# Altium footprint library MyPcbLib.PcbLib: 237 footprints (part 1 of 15)
Each footprint in its own frame and in the unit in brackets; x right, y up, seen from the top. Pads: shape width x height; smd on the part's side, far side on the other; paste and mask are expansions set on the pad; w line width, h text height; cw(c..) or ccw(c..) is an arc to the next point about the centre after c.
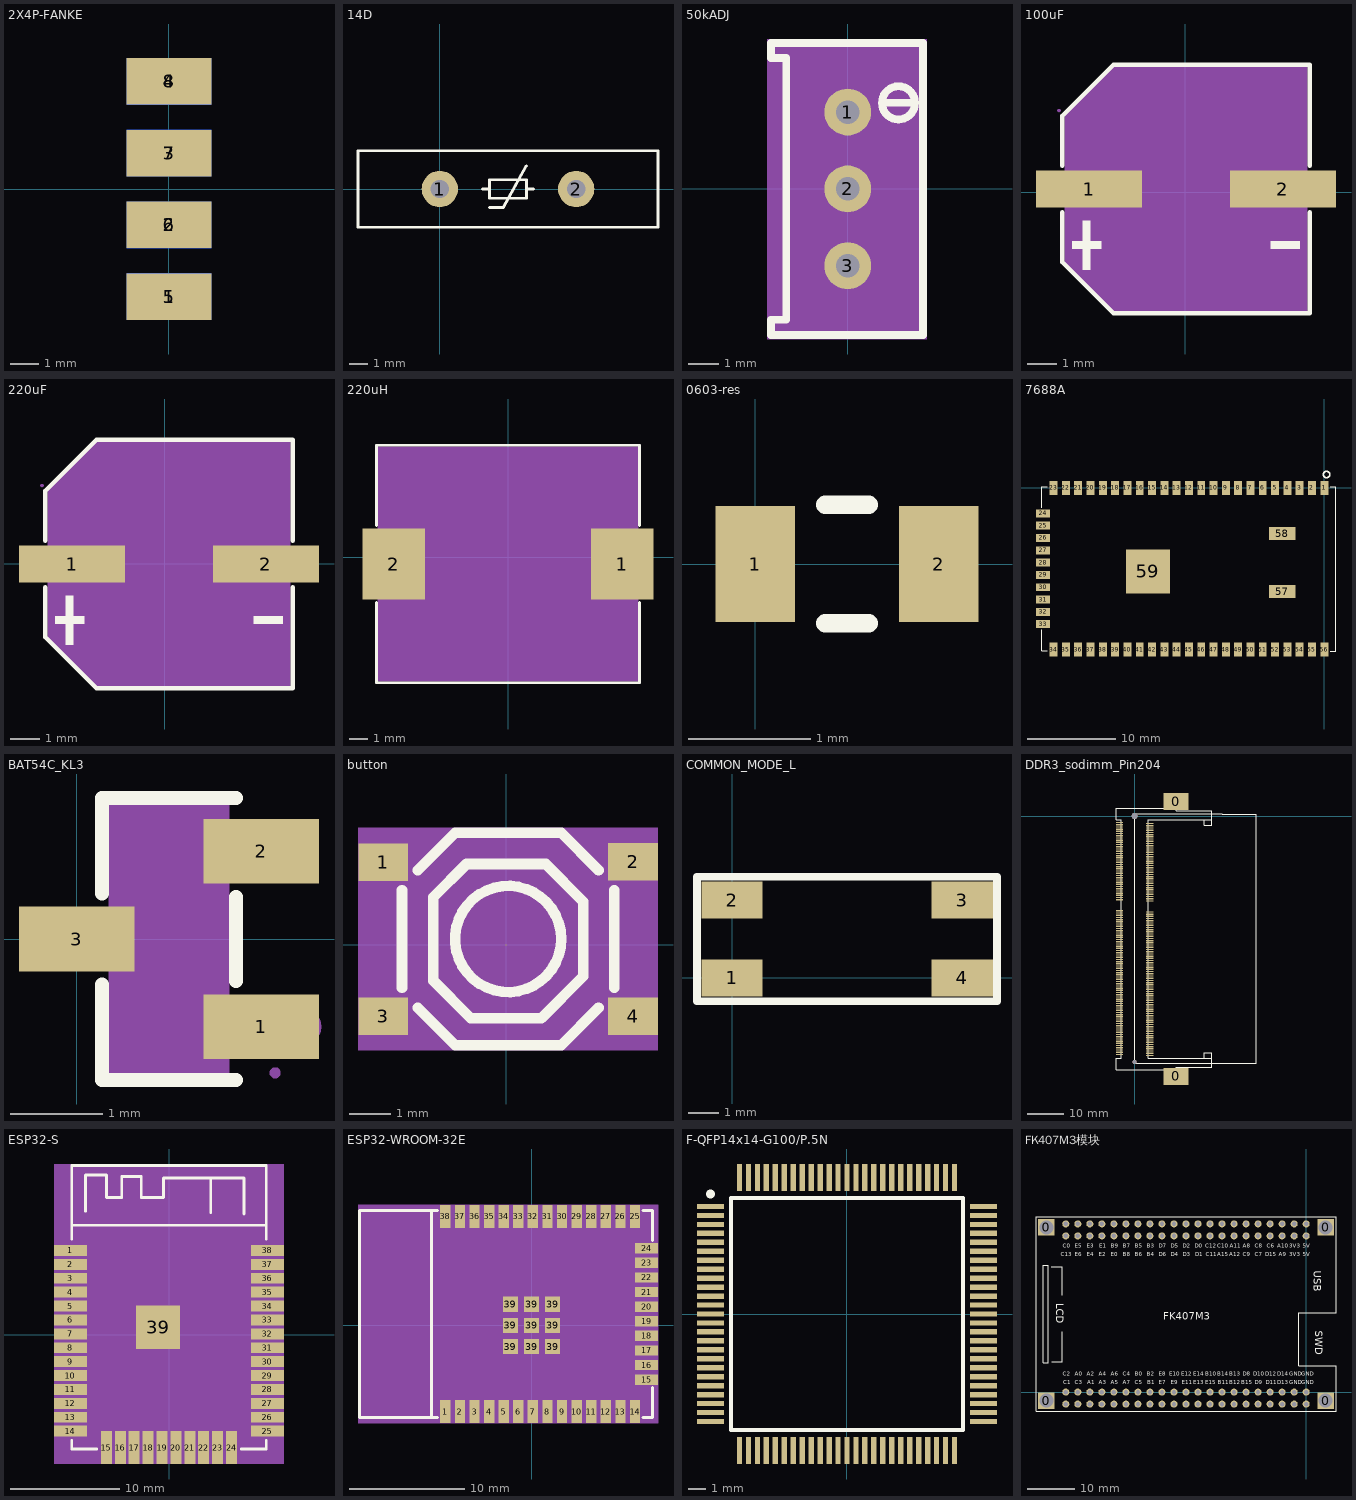
[diagram p0: the footprints below, top view; thin cyan lines are the x and y axes]

## 2X4P-FANKE [mm]
pads (8):
  rect 3x1.65 smd: 1(0,-3.81) 2(0,-1.27) 3(0,1.27) 4(0,3.81)
  rect 3x1.65 smd far side: 5(0,-3.81) 6(0,-1.27) 7(0,1.27) 8(0,3.81)
3D body "User Library-2_54mm Male Header (4x2).STEP": height 1.84, standoff -3.14, extent -1.249,-5.08 10.291,5.08

## 14D [mm]
pads (2):
  round 2 hole 1: 1(0,0) 2(7.5,0)
Top Overlay:
  lines w0.152: 2.353,0 2.734,0 ; 2.734,-1.016 3.496,-1.016 4.766,1.27 ; 4.766,0 5.147,0 ; -4.5,-2.1 12,-2.1 12,2.1 -4.5,2.1 -4.5,-2.1 ; 2.734,-0.508 2.734,0.508 4.766,0.508 4.766,-0.508 2.734,-0.508

## 50kADJ [mil]
pads (3):
  round 60 hole 30: 1(0,98.42) 2(0,0) 3(0,-98.42)
Top Overlay:
  lines w10: 50,110.39 65,110.39 ; 86.2,109.99 cw(c64.99,110.19) 86.2,110.4 ; 96.46,-187.22 -96.46,-187.22 -98.42,-187.22 -98.42,-167.52 -78.74,-167.52 -78.74,167.52 -98.42,167.52 -98.42,187.01 -96.46,187.01 96.46,187.01 96.46,-187.01 ; 65,110.39 80,110.39 65,110.39
Mechanical 4:
  region: -103.42,192.01 101.46,192.01 101.46,-192.22 -103.42,-192.22
Mechanical 5:
  region: -30,30 30,30 30,-30 -30,-30
  region: -30,128.43 30,128.43 30,68.42 -30,68.42
  region: -30,-68.42 30,-68.42 30,-128.43 -30,-128.43
Mechanical 15:
  lines w0.1: -1.98,14.34 0.02,16.34

## 100uF [mm]
pads (2):
  rect 3.61x1.26 smd: 1(-3.275,0.111) 2(3.315,0.111)
Top Overlay:
  region: 3.896,-1.673 3.896,-1.922 2.9,-1.922 2.9,-1.673
  region: -3.856,-1.673 -3.856,-1.922 -2.86,-1.922 -2.86,-1.673
  region: -3.483,-0.968 -3.483,-2.628 -3.234,-2.628 -3.234,-0.968
  lines w0.152: -4.181,-0.671 -4.181,-2.379 -2.445,-4.115 4.221,-4.115 4.221,-0.671 ; -4.181,0.894 -4.181,2.601 -2.445,4.338 4.221,4.338 4.221,0.894
Mechanical 4:
  region: 4.145,4.261 4.145,-4.039 -2.445,-4.039 -4.105,-2.379 -4.105,2.601 -2.445,4.261
Mechanical 5:
  region: 4.52,0.561 4.52,-0.339 1.57,-0.339 1.57,0.561
  region: -4.48,0.561 -4.48,-0.339 -1.53,-0.339 -1.53,0.561
Mechanical 6:
  circle w0.06: c-4.298,2.778 r0.03
Mechanical 15:
  region: 3.896,0.236 3.896,-0.013 2.9,-0.013 2.9,0.236
  region: -3.856,0.236 -3.856,-0.013 -2.86,-0.013 -2.86,0.236
  region: -3.483,0.941 -3.483,-0.719 -3.234,-0.719 -3.234,0.941

## 220uF [mm]
pads (2):
  rect 3.61x1.26 smd: 1(-3.148,-0.016) 2(3.442,-0.016)
Top Overlay:
  region: 4.023,-1.8 4.023,-2.049 3.027,-2.049 3.027,-1.8
  region: -3.729,-1.8 -3.729,-2.049 -2.733,-2.049 -2.733,-1.8
  region: -3.356,-1.095 -3.356,-2.755 -3.107,-2.755 -3.107,-1.095
  lines w0.152: -4.054,-0.798 -4.054,-2.506 -2.318,-4.242 4.348,-4.242 4.348,-0.798 ; -4.054,0.767 -4.054,2.474 -2.318,4.211 4.348,4.211 4.348,0.767
Mechanical 4:
  region: 4.272,4.134 4.272,-4.166 -2.318,-4.166 -3.978,-2.506 -3.978,2.474 -2.318,4.134
Mechanical 5:
  region: 4.647,0.434 4.647,-0.466 1.697,-0.466 1.697,0.434
  region: -4.353,0.434 -4.353,-0.466 -1.403,-0.466 -1.403,0.434
Mechanical 6:
  circle w0.06: c-4.171,2.651 r0.03
Mechanical 15:
  region: 4.023,0.109 4.023,-0.14 3.027,-0.14 3.027,0.109
  region: -3.729,0.109 -3.729,-0.14 -2.733,-0.14 -2.733,0.109
  region: -3.356,0.814 -3.356,-0.846 -3.107,-0.846 -3.107,0.814

## 220uH [mm]
pads (2):
  rect 3.424x3.92 smd: 1(6.267,-0.383) 2(-6.289,-0.383)
Top Overlay:
  lines w0.152: -7.237,-2.495 -7.237,-6.909 7.215,-6.909 7.215,-2.495 ; -7.237,1.73 -7.237,6.144 7.215,6.144 7.215,1.73
Mechanical 4:
  region: -7.161,-6.833 -7.161,6.067 7.139,6.067 7.139,-6.833
Mechanical 5:
  region: 7.139,-2.133 7.139,1.367 4.639,1.367 4.639,-2.133
  region: -7.161,-2.133 -7.161,1.367 -4.661,1.367 -4.661,-2.133
Mechanical 6:
  circle w0.06: c-7.161,-6.833 r0.03
Mechanical 15:
  lines w0.003: -0.036,0.006 0.014,0.056

## 0603-res [mm]
height 0.35
pads (2):
  rect 0.65x0.95 smd: 1(0,0) 2(1.5,0)
Top Overlay:
  lines w0.152: 0.572,-0.483 0.928,-0.483 ; 0.572,0.483 0.928,0.483
3D body "0603-res.step": height 0.35, standoff 0, extent -0.125,-0.475 1.625,0.475

## 7688A [mm]
height 2.5
pads (59):
  rect 0.9x1.6 smd: 1(0,0) 2(-1.4,0) 3(-2.8,0) 4(-4.2,0) 5(-5.6,0) 6(-7,0) 7(-8.4,0) 8(-9.8,0) 9(-11.2,0) 10(-12.6,0) 11(-14,0) 12(-15.4,0) 13(-16.8,0) 14(-18.2,0) 15(-19.6,0) 16(-21,0) 17(-22.4,0) 18(-23.8,0) 19(-25.2,0) 20(-26.6,0) 21(-28,0) 22(-29.4,0) 23(-30.8,0) 34(-30.8,-18.4) 35(-29.4,-18.4) 36(-28,-18.4) 37(-26.6,-18.4) 38(-25.2,-18.4) 39(-23.8,-18.4) 40(-22.4,-18.4) 41(-21,-18.4) 42(-19.6,-18.4) 43(-18.2,-18.4) 44(-16.8,-18.4) 45(-15.4,-18.4) 46(-14,-18.4) 47(-12.6,-18.4) 48(-11.2,-18.4) 49(-9.8,-18.4) 50(-8.4,-18.4) 51(-7,-18.4) 52(-5.6,-18.4) 53(-4.2,-18.4) 54(-2.8,-18.4) 55(-1.4,-18.4) 56(0,-18.4)
  rect 1.6x0.9 smd: 24(-32,-2.9) 25(-32,-4.3) 26(-32,-5.7) 27(-32,-7.1) 28(-32,-8.5) 29(-32,-9.9) 30(-32,-11.3) 31(-32,-12.7) 32(-32,-14.1) 33(-32,-15.5)
  rect 3x1.5 smd: 57(-4.8,-11.8) 58(-4.8,-5.2)
  rect 5x5 smd: 59(-20.066,-9.5)
Top Overlay:
  circle w0.15: c0.254,1.524 r0.359
  lines w0.1: -32.131,-16.129 -32.131,-18.542 -31.496,-18.542 ; -32.131,-2.271 -32.131,0.142 -31.496,0.142 ; 0.696,-18.557 1.331,-18.557 1.331,0.142 0.696,0.142

## BAT54C_KL3 [mm]
pads (3):
  rect 1.25x0.7 smd: 1(2,-0.95) 2(2,0.95) 3(0,0)
Top Overlay:
  lines w0.152: 0.274,-0.495 0.274,-1.526 1.726,-1.526 ; 0.274,0.495 0.274,1.526 1.726,1.526 ; 1.726,-0.455 1.726,0.455
Mechanical 4:
  region: 0.35,-1.45 0.35,1.45 1.65,1.45 1.65,-1.45
Mechanical 5:
  region: 1.85,-1.165 1.85,-0.735 2.15,-0.735 2.15,-1.165
  pour cut-out: 1.64,-1.165 1.64,-0.735 1.86,-0.735 1.86,-1.165
  region: 1.85,0.735 1.85,1.165 2.15,1.165 2.15,0.735
  pour cut-out: 1.64,0.735 1.64,1.165 1.86,1.165 1.86,0.735
  region: 0.15,-0.215 0.15,0.215 -0.15,0.215 -0.15,-0.215
  pour cut-out: 0.14,-0.215 0.14,0.215 0.36,0.215 0.36,-0.215
Mechanical 6:
  circle w0.06: c2.15,-1.45 r0.03
Mechanical 15:
  circle w0.2: c2.45,-0.95 r0.1

## button [mm]
pads (4):
  rect 1.2x0.9 smd: 1(-2.949,1.986) 2(3.051,1.988) 3(-2.949,-1.713) 4(3.051,-1.713)
Top Overlay:
  circle w0.254: c0.051,0.137 r1.275
  lines w0.254: -2.499,-1.031 -2.499,1.306 ; -2.119,-1.518 -1.224,-2.413 1.326,-2.413 2.221,-1.518 ; -2.119,1.792 -1.224,2.687 1.326,2.687 2.221,1.792 ; 2.601,-1.031 2.601,1.306 ; -1.75,-0.861 -0.848,-1.763 0.851,-1.763 1.852,-0.762 1.852,1.036 0.95,1.938 -0.95,1.938 -1.75,1.138 -1.75,-0.861
Mechanical 4:
  region: -3.556,2.814 3.65,2.814 3.65,-2.54 -3.556,-2.54
Mechanical 5:
  region: -3.549,2.436 -2.35,2.436 -2.35,1.537 -3.549,1.537
  region: 2.451,2.438 3.65,2.438 3.65,1.537 2.451,1.537
  region: -3.549,-1.262 -2.35,-1.262 -2.35,-2.164 -3.549,-2.164
  region: 2.451,-1.262 3.65,-1.262 3.65,-2.164 2.451,-2.164

## COMMON_MODE_L [mm]
pads (4):
  rect 2x1.2 smd: 1(0,0) 2(0,2.54) 3(7.5,2.54) 4(7.5,0)
Top Overlay:
  lines w0.254: -1.143,-0.762 8.636,-0.762 8.636,3.302 -1.143,3.302 -1.143,-0.762

## DDR3_sodimm_Pin204 [mm]
pads (208):
  round 1.1 hole 1.1 unplated: 0(0,-66.8)
  round 1.6 hole 1.6 unplated: 0(0,0)
  rect 6.8x4.7 smd: 0(11.3,-70.75) 0(11.3,3.95)
  rect 2x0.35 smd: 1(-4.1,-1.75) 2(4.1,-2.05) 3(-4.1,-2.35) 4(4.1,-2.65) 5(-4.1,-2.95) 6(4.1,-3.25) 7(-4.1,-3.55) 8(4.1,-3.85) 9(-4.1,-4.15) 10(4.1,-4.45) 11(-4.1,-4.75) 12(4.1,-5.05) 13(-4.1,-5.35) 14(4.1,-5.65) 15(-4.1,-5.95) 16(4.1,-6.25) 17(-4.1,-6.55) 18(4.1,-6.85) 19(-4.1,-7.15) 20(4.1,-7.45) 21(-4.1,-7.75) 22(4.1,-8.05) 23(-4.1,-8.35) 24(4.1,-8.65) 25(-4.1,-8.95) 26(4.1,-9.25) 27(-4.1,-9.55) 28(4.1,-9.85) 29(-4.1,-10.15) 30(4.1,-10.45) 31(-4.1,-10.75) 32(4.1,-11.05) 33(-4.1,-11.35) 34(4.1,-11.65) 35(-4.1,-11.95) 36(4.1,-12.25) 37(-4.1,-12.55) 38(4.1,-12.85) 39(-4.1,-13.15) 40(4.1,-13.45) 41(-4.1,-13.75) 42(4.1,-14.05) 43(-4.1,-14.35) 44(4.1,-14.65) 45(-4.1,-14.95) 46(4.1,-15.25) 47(-4.1,-15.55) 48(4.1,-15.85) 49(-4.1,-16.15) 50(4.1,-16.45) 51(-4.1,-16.75) 52(4.1,-17.05) 53(-4.1,-17.35) 54(4.1,-17.65) 55(-4.1,-17.95) 56(4.1,-18.25) 57(-4.1,-18.55) 58(4.1,-18.85) 59(-4.1,-19.15) 60(4.1,-19.45) 61(-4.1,-19.75) 62(4.1,-20.05) 63(-4.1,-20.35) 64(4.1,-20.65) 65(-4.1,-20.95) 66(4.1,-21.25) 67(-4.1,-21.55) 68(4.1,-21.85) 69(-4.1,-22.15) 70(4.1,-22.45) 71(-4.1,-22.75) 72(4.1,-23.05) 73(-4.1,-25.75) 74(4.1,-26.05) 75(-4.1,-26.35) 76(4.1,-26.65) 77(-4.1,-26.95) 78(4.1,-27.25) 79(-4.1,-27.55) 80(4.1,-27.85) 81(-4.1,-28.15) 82(4.1,-28.45) 83(-4.1,-28.75) 84(4.1,-29.05) 85(-4.1,-29.35) 86(4.1,-29.65) 87(-4.1,-29.95) 88(4.1,-30.25) 89(-4.1,-30.55) 90(4.1,-30.85) 91(-4.1,-31.15) 92(4.1,-31.45) 93(-4.1,-31.75) 94(4.1,-32.05) 95(-4.1,-32.35) 96(4.1,-32.65) 97(-4.1,-32.95) 98(4.1,-33.25) 99(-4.1,-33.55) 100(4.1,-33.85) 101(-4.1,-34.15) 102(4.1,-34.45) 103(-4.1,-34.75) 104(4.1,-35.05) 105(-4.1,-35.35) 106(4.1,-35.65) 107(-4.1,-35.95) 108(4.1,-36.25) 109(-4.1,-36.55) 110(4.1,-36.85) 111(-4.1,-37.15) 112(4.1,-37.45) 113(-4.1,-37.75) 114(4.1,-38.05) 115(-4.1,-38.35) 116(4.1,-38.65) 117(-4.1,-38.95) 118(4.1,-39.25) 119(-4.1,-39.55) 120(4.1,-39.85) 121(-4.1,-40.15) 122(4.1,-40.45) 123(-4.1,-40.75) 124(4.1,-41.05) 125(-4.1,-41.35) 126(4.1,-41.65) 127(-4.1,-41.95) 128(4.1,-42.25) 129(-4.1,-42.55) 130(4.1,-42.85) 131(-4.1,-43.15) 132(4.1,-43.45) 133(-4.1,-43.75) 134(4.1,-44.05) 135(-4.1,-44.35) 136(4.1,-44.65) 137(-4.1,-44.95) 138(4.1,-45.25) 139(-4.1,-45.55) 140(4.1,-45.85) 141(-4.1,-46.15) 142(4.1,-46.45) 143(-4.1,-46.75) 144(4.1,-47.05) 145(-4.1,-47.35) 146(4.1,-47.65) 147(-4.1,-47.95) 148(4.1,-48.25) 149(-4.1,-48.55) 150(4.1,-48.85) 151(-4.1,-49.15) 152(4.1,-49.45) 153(-4.1,-49.75) 154(4.1,-50.05) 155(-4.1,-50.35) 156(4.1,-50.65) 157(-4.1,-50.95) 158(4.1,-51.25) 159(-4.1,-51.55) 160(4.1,-51.85) 161(-4.1,-52.15) 162(4.1,-52.45) 163(-4.1,-52.75) 164(4.1,-53.05) 165(-4.1,-53.35) 166(4.1,-53.65) 167(-4.1,-53.95) 168(4.1,-54.25) 169(-4.1,-54.55) 170(4.1,-54.85) 171(-4.1,-55.15) 172(4.1,-55.45) 173(-4.1,-55.75) 174(4.1,-56.05) 175(-4.1,-56.35) 176(4.1,-56.65) 177(-4.1,-56.95) 178(4.1,-57.25) 179(-4.1,-57.55) 180(4.1,-57.85) 181(-4.1,-58.15) 182(4.1,-58.45) 183(-4.1,-58.75) 184(4.1,-59.05) 185(-4.1,-59.35) 186(4.1,-59.65) 187(-4.1,-59.95) 188(4.1,-60.25) 189(-4.1,-60.55) 190(4.1,-60.85) 191(-4.1,-61.15) 192(4.1,-61.45) 193(-4.1,-61.75) 194(4.1,-62.05) 195(-4.1,-62.35) 196(4.1,-62.65) 197(-4.1,-62.95) 198(4.1,-63.25) 199(-4.1,-63.55) 200(4.1,-63.85) 201(-4.1,-64.15) 202(4.1,-64.45) 203(-4.1,-64.75) 204(4.1,-65.05)
Top Overlay:
  lines w0.15: 20.9,-65.75 3.7,-65.75 3.7,-1.05 20.9,-1.05 ; 20.9,-65.75 20.9,-68.25 11.3,-68.25 11.3,-68.95 -5,-68.95 -5,-65.75 -3.7,-65.75 -3.7,-1.05 -5,-1.05 -5,2.15 11.3,2.15 11.3,1.45 20.9,1.45 20.9,-1.05 ; 20.9,-65.75 20.9,-64.35 18.9,-64.35 18.9,-65.75 20.9,-65.75 ; 20.9,-1.05 18.9,-1.05 18.9,-2.45 20.9,-2.45 20.9,-1.05
  lines w0.152: 23.825,0.566 0,0.566 0,-67.1 33.013,-67.1 33.013,0.553 23.838,0.553

## ESP32-S [mm]
pads (39):
  rect 3x1 smd: 1(-9.041,7.699) 2(-9.041,6.429) 3(-9.041,5.159) 4(-9.041,3.889) 5(-9.041,2.619) 6(-9.041,1.349) 7(-9.041,0.079) 8(-9.041,-1.191) 9(-9.041,-2.461) 10(-9.041,-3.731) 11(-9.041,-5.001) 12(-9.041,-6.271) 13(-9.041,-7.541) 14(-9.041,-8.811) 25(8.959,-8.811) 26(8.959,-7.541) 27(8.959,-6.271) 28(8.959,-5.001) 29(8.959,-3.731) 30(8.959,-2.461) 31(8.959,-1.191) 32(8.959,0.079) 33(8.959,1.349) 34(8.959,2.619) 35(8.959,3.889) 36(8.959,5.159) 37(8.959,6.429) 38(8.959,7.699)
  rect 1x3 smd: 15(-5.756,-10.311) 16(-4.486,-10.311) 17(-3.216,-10.311) 18(-1.946,-10.311) 19(-0.676,-10.311) 20(0.594,-10.311) 21(1.864,-10.311) 22(3.134,-10.311) 23(4.404,-10.311) 24(5.674,-10.311)
  rect 4x4 smd: 39(-1.041,0.689)
Top Overlay:
  lines w0.254: -8.931,-9.676 -8.931,-10.438 -6.645,-10.438 ; -8.931,8.739 -8.931,15.47 8.849,15.47 8.849,8.739 ; -8.931,10.009 8.849,10.009 ; -7.661,11.278 -7.661,14.58 -5.756,14.58 -5.756,12.548 -4.359,12.548 -4.359,14.453 -2.581,14.453 -2.581,12.548 -0.549,12.548 -0.549,14.326 6.817,14.326 6.817,11.024 ; 3.769,11.152 3.769,14.327 ; 6.563,-10.438 8.849,-10.438 8.849,-9.676
Mechanical 4:
  region: -10.541,15.597 10.465,15.597 10.465,-11.811 -10.541,-11.811
Mechanical 5:
  drawing of 39 lines, arcs and shapes, not listed

## ESP32-WROOM-32E [mm]
pads (47):
  rect 0.9x2 smd: 1(-7.512,-7.5) 2(-6.242,-7.5) 3(-4.972,-7.5) 4(-3.702,-7.5) 5(-2.432,-7.5) 6(-1.162,-7.5) 7(0.108,-7.5) 8(1.378,-7.5) 9(2.648,-7.5) 10(3.918,-7.5) 11(5.188,-7.5) 12(6.458,-7.5) 13(7.728,-7.5) 14(8.998,-7.5) 25(8.998,9.5) 26(7.728,9.5) 27(6.458,9.5) 28(5.188,9.5) 29(3.918,9.5) 30(2.648,9.5) 31(1.378,9.5) 32(0.108,9.5) 33(-1.162,9.5) 34(-2.432,9.5) 35(-3.702,9.5) 36(-4.972,9.5) 37(-6.242,9.5) 38(-7.512,9.5)
  rect 2x0.9 smd: 15(9.998,-4.715) 16(9.998,-3.445) 17(9.998,-2.175) 18(9.998,-0.905) 19(9.998,0.365) 20(9.998,1.635) 21(9.998,2.905) 22(9.998,4.175) 23(9.998,5.445) 24(9.998,6.715)
  rect 1.33x1.33 smd: 39(-1.847,-1.835) 39(-1.847,0) 39(-1.847,1.835) 39(-0.012,-1.835) 39(-0.012,0) 39(-0.012,1.835) 39(1.823,-1.835) 39(1.823,0) 39(1.823,1.835)
Top Overlay:
  lines w0.254: -8.702,10 -8.702,-8 -8.193,-8 ; -8.702,10.017 -8.193,10.017 ; -8.536,-8 -14.986,-8 -14.986,10 -8.52,10 ; 9.679,-8 10.514,-8 10.514,-5.396 ; 9.679,10.017 10.514,10.017 10.514,7.396
Mechanical 4:
  region: -15.113,-8.509 -15.113,10.5 10.998,10.5 10.998,-8.509
Mechanical 5:
  drawing of 47 lines, arcs and shapes, not listed
Mechanical 15:
  lines w0.003: -2.083,1.45 -2.032,1.501

## F-QFP14x14-G100/P.5N [mm] "QFP; 100 Leads; Body 14 x 14 mm; Pitch 0.5 mm"
height 1.7
pads (100):
  rect 1.5x0.3 smd: 1(-7.625,6) 2(-7.625,5.5) 3(-7.625,5) 4(-7.625,4.5) 5(-7.625,4) 6(-7.625,3.5) 7(-7.625,3) 8(-7.625,2.5) 9(-7.625,2) 10(-7.625,1.5) 11(-7.625,1) 12(-7.625,0.5) 13(-7.625,0) 14(-7.625,-0.5) 15(-7.625,-1) 16(-7.625,-1.5) 17(-7.625,-2) 18(-7.625,-2.5) 19(-7.625,-3) 20(-7.625,-3.5) 21(-7.625,-4) 22(-7.625,-4.5) 23(-7.625,-5) 24(-7.625,-5.5) 25(-7.625,-6) 51(7.625,-6) 52(7.625,-5.5) 53(7.625,-5) 54(7.625,-4.5) 55(7.625,-4) 56(7.625,-3.5) 57(7.625,-3) 58(7.625,-2.5) 59(7.625,-2) 60(7.625,-1.5) 61(7.625,-1) 62(7.625,-0.5) 63(7.625,0) 64(7.625,0.5) 65(7.625,1) 66(7.625,1.5) 67(7.625,2) 68(7.625,2.5) 69(7.625,3) 70(7.625,3.5) 71(7.625,4) 72(7.625,4.5) 73(7.625,5) 74(7.625,5.5) 75(7.625,6)
  rect 0.3x1.5 smd: 26(-6,-7.625) 27(-5.5,-7.625) 28(-5,-7.625) 29(-4.5,-7.625) 30(-4,-7.625) 31(-3.5,-7.625) 32(-3,-7.625) 33(-2.5,-7.625) 34(-2,-7.625) 35(-1.5,-7.625) 36(-1,-7.625) 37(-0.5,-7.625) 38(0,-7.625) 39(0.5,-7.625) 40(1,-7.625) 41(1.5,-7.625) 42(2,-7.625) 43(2.5,-7.625) 44(3,-7.625) 45(3.5,-7.625) 46(4,-7.625) 47(4.5,-7.625) 48(5,-7.625) 49(5.5,-7.625) 50(6,-7.625) 76(6,7.625) 77(5.5,7.625) 78(5,7.625) 79(4.5,7.625) 80(4,7.625) 81(3.5,7.625) 82(3,7.625) 83(2.5,7.625) 84(2,7.625) 85(1.5,7.625) 86(1,7.625) 87(0.5,7.625) 88(0,7.625) 89(-0.5,7.625) 90(-1,7.625) 91(-1.5,7.625) 92(-2,7.625) 93(-2.5,7.625) 94(-3,7.625) 95(-3.5,7.625) 96(-4,7.625) 97(-4.5,7.625) 98(-5,7.625) 99(-5.5,7.625) 100(-6,7.625)
Top Overlay:
  circle w0.25: c-7.625,6.7 r0.125
  lines w0.2: -6.475,-6.475 6.475,-6.475 6.475,6.475 -6.475,6.475 -6.475,-6.475
3D body "stm32h750vbt6.x_t": height 1.48, standoff 0, extent -8.002,-7.998 7.998,8.002

## FK407M3模块 [mm]
pads (88):
  rect 3.5x3.5 hole 3: 0(-54.887,-1.8) 0(-54.887,34.82) 0(4.093,-1.8) 0(4.093,34.82)
  round 1.5 hole 0.9: 1(0,35.56) 2(0,33.02) 3(-2.54,35.56) 4(-2.54,33.02) 5(-5.08,35.56) 6(-5.08,33.02) 7(-7.62,35.56) 8(-7.62,33.02) 9(-10.16,35.56) 10(-10.16,33.02) 11(-12.7,35.56) 12(-12.7,33.02) 13(-15.24,35.56) 14(-15.24,33.02) 15(-17.78,35.56) 16(-17.78,33.02) 17(-20.32,35.56) 18(-20.32,33.02) 19(-22.86,35.56) 20(-22.86,33.02) 21(-25.4,35.56) 22(-25.4,33.02) 23(-27.94,35.56) 24(-27.94,33.02) 25(-30.48,35.56) 26(-30.48,33.02) 27(-33.02,35.56) 28(-33.02,33.02) 29(-35.56,35.56) 30(-35.56,33.02) 31(-38.1,35.56) 32(-38.1,33.02) 33(-40.64,35.56) 34(-40.64,33.02) 35(-43.18,35.56) 36(-43.18,33.02) 37(-45.72,35.56) 38(-45.72,33.02) 39(-48.26,35.56) 40(-48.26,33.02) 41(-50.8,35.56) 42(-50.8,33.02) 43(0,0) 44(0,-2.54) 45(-2.54,0) 46(-2.54,-2.54) 47(-5.08,0) 48(-5.08,-2.54) 49(-7.62,0) 50(-7.62,-2.54) 51(-10.16,0) 52(-10.16,-2.54) 53(-12.7,0) 54(-12.7,-2.54) 55(-15.24,0) 56(-15.24,-2.54) 57(-17.78,0) 58(-17.78,-2.54) 59(-20.32,0) 60(-20.32,-2.54) 61(-22.86,0) 62(-22.86,-2.54) 63(-25.4,0) 64(-25.4,-2.54) 65(-27.94,0) 66(-27.94,-2.54) 67(-30.48,0) 68(-30.48,-2.54) 69(-33.02,0) 70(-33.02,-2.54) 71(-35.56,0) 72(-35.56,-2.54) 73(-38.1,0) 74(-38.1,-2.54) 75(-40.64,0) 76(-40.64,-2.54) 77(-43.18,0) 78(-43.18,-2.54) 79(-45.72,0) 80(-45.72,-2.54) 81(-48.26,0) 82(-48.26,-2.54) 83(-50.8,0) 84(-50.8,-2.54)
Top Overlay:
  lines w0.254: -53.871,26.518 -51.585,26.518 -51.585,20.422 ; -53.744,6.452 -51.585,6.452 -51.585,12.802 ; -57.097,-4.01 6.303,-4.01 6.303,5.593 -1.591,5.593 -1.591,16.793 6.303,16.793 6.303,37.03 -57.097,37.03 -57.097,-4.01 ; -55.564,6.183 -55.564,26.802 -54.548,26.802 -54.548,6.183 -55.564,6.183
  text "FK407M3" at -30.249,15.342 h1.52
  text "LCD" at -52.855,18.771 h1.52
  text "SWD" at 1.882,12.929 h1.52
  text "GND" at -1.083,1.666 h0.81
  text "GND" at -3.623,1.666 h0.81
  text "D13" at -6.096,1.666 h0.81
  text "D11" at -8.5,1.666 h0.81
  text "D9" at -10.837,1.666 h0.81
  text "B15" at -13.716,1.666 h0.81
  text "B12" at -16.256,1.666 h0.81
  text "B11" at -18.66,1.666 h0.81
  text "E15" at -21.336,1.666 h0.81
  text "E13" at -23.876,1.666 h0.81
  text "E11" at -26.28,1.666 h0.81
  text "E9" at -28.617,1.666 h0.81
  text "E7" at -31.157,1.666 h0.81
  text "B1" at -33.562,1.666 h0.81
  text "C5" at -36.237,1.666 h0.81
  text "A7" at -38.777,1.666 h0.81
  text "A5" at -41.317,1.666 h0.81
  text "A3" at -43.857,1.666 h0.81
  text "A1" at -46.262,1.666 h0.81
  text "C3" at -48.937,1.666 h0.81
  text "C1" at -51.342,1.666 h0.81
  text "C2" at -51.477,3.48 h0.81
  text "A0" at -48.937,3.48 h0.81
  text "A2" at -46.397,3.48 h0.81
  text "A4" at -43.857,3.48 h0.81
  text "A6" at -41.317,3.48 h0.81
  text "C4" at -38.777,3.48 h0.81
  text "B0" at -36.237,3.48 h0.81
  text "B2" at -33.697,3.48 h0.81
  text "E8" at -31.157,3.48 h0.81
  text "E10" at -28.956,3.48 h0.81
  text "E12" at -26.416,3.48 h0.81
  text "E14" at -23.876,3.48 h0.81
  text "B10" at -21.336,3.48 h0.81
  text "B14" at -18.796,3.48 h0.81
  text "B13" at -16.256,3.48 h0.81
  text "D8" at -13.377,3.48 h0.81
  text "D10" at -11.176,3.48 h0.81
  text "D12" at -8.636,3.48 h0.81
  text "D14" at -6.096,3.48 h0.81
  text "GND" at -3.623,3.48 h0.81
  text "GND" at -1.083,3.48 h0.81
  text "5V" at -0.677,28.727 h0.81
  text "3V3" at -3.623,28.727 h0.81
  text "A9" at -5.757,28.727 h0.81
  text "D15" at -8.636,28.727 h0.81
  text "C7" at -10.837,28.727 h0.81
  text "C9" at -13.377,28.727 h0.81
  text "A12" at -16.256,28.727 h0.81
  text "A15" at -18.796,28.727 h0.81
  text "C11" at -21.2,28.727 h0.81
  text "D1" at -23.402,28.727 h0.81
  text "D3" at -26.077,28.727 h0.81
  text "D4" at -28.617,28.727 h0.81
  text "D6" at -31.157,28.727 h0.81
  text "B4" at -33.697,28.727 h0.81
  text "B6" at -36.237,28.727 h0.81
  text "B8" at -38.777,28.727 h0.81
  text "E0" at -41.317,28.727 h0.81
  text "E2" at -43.857,28.727 h0.81
  text "E4" at -46.397,28.727 h0.81
  text "E6" at -48.937,28.727 h0.81
  text "C13" at -51.816,28.727 h0.81
  text "C0" at -51.477,30.556 h0.81
  text "E5" at -48.937,30.556 h0.81
  text "E3" at -46.397,30.556 h0.81
  text "E1" at -43.722,30.556 h0.81
  text "B9" at -41.317,30.556 h0.81
  text "B7" at -38.777,30.556 h0.81
  text "B5" at -36.237,30.556 h0.81
  text "B3" at -33.697,30.556 h0.81
  text "D7" at -31.157,30.556 h0.81
  text "D5" at -28.617,30.556 h0.81
  text "D2" at -26.077,30.556 h0.81
  text "D0" at -23.537,30.556 h0.81
  text "C12" at -21.336,30.556 h0.81
  text "C10" at -18.796,30.556 h0.81
  text "A11" at -16.12,30.556 h0.81
  text "A8" at -13.377,30.556 h0.81
  text "C8" at -10.837,30.556 h0.81
  text "C6" at -8.297,30.556 h0.81
  text "A10" at -6.096,30.556 h0.81
  text "3V3" at -3.623,30.556 h0.81
  text "5V" at -0.677,30.556 h0.81
  text "USB" at 1.628,25.629 h1.52